# Altium footprint library Standard.PcbLib: 137 footprints (part 8 of 9)
Each footprint in its own frame and in the unit in brackets; x right, y up, seen from the top. Pads: shape width x height; smd on the part's side, far side on the other; paste and mask are expansions set on the pad; w line width, h text height; cw(c..) or ccw(c..) is an arc to the next point about the centre after c.
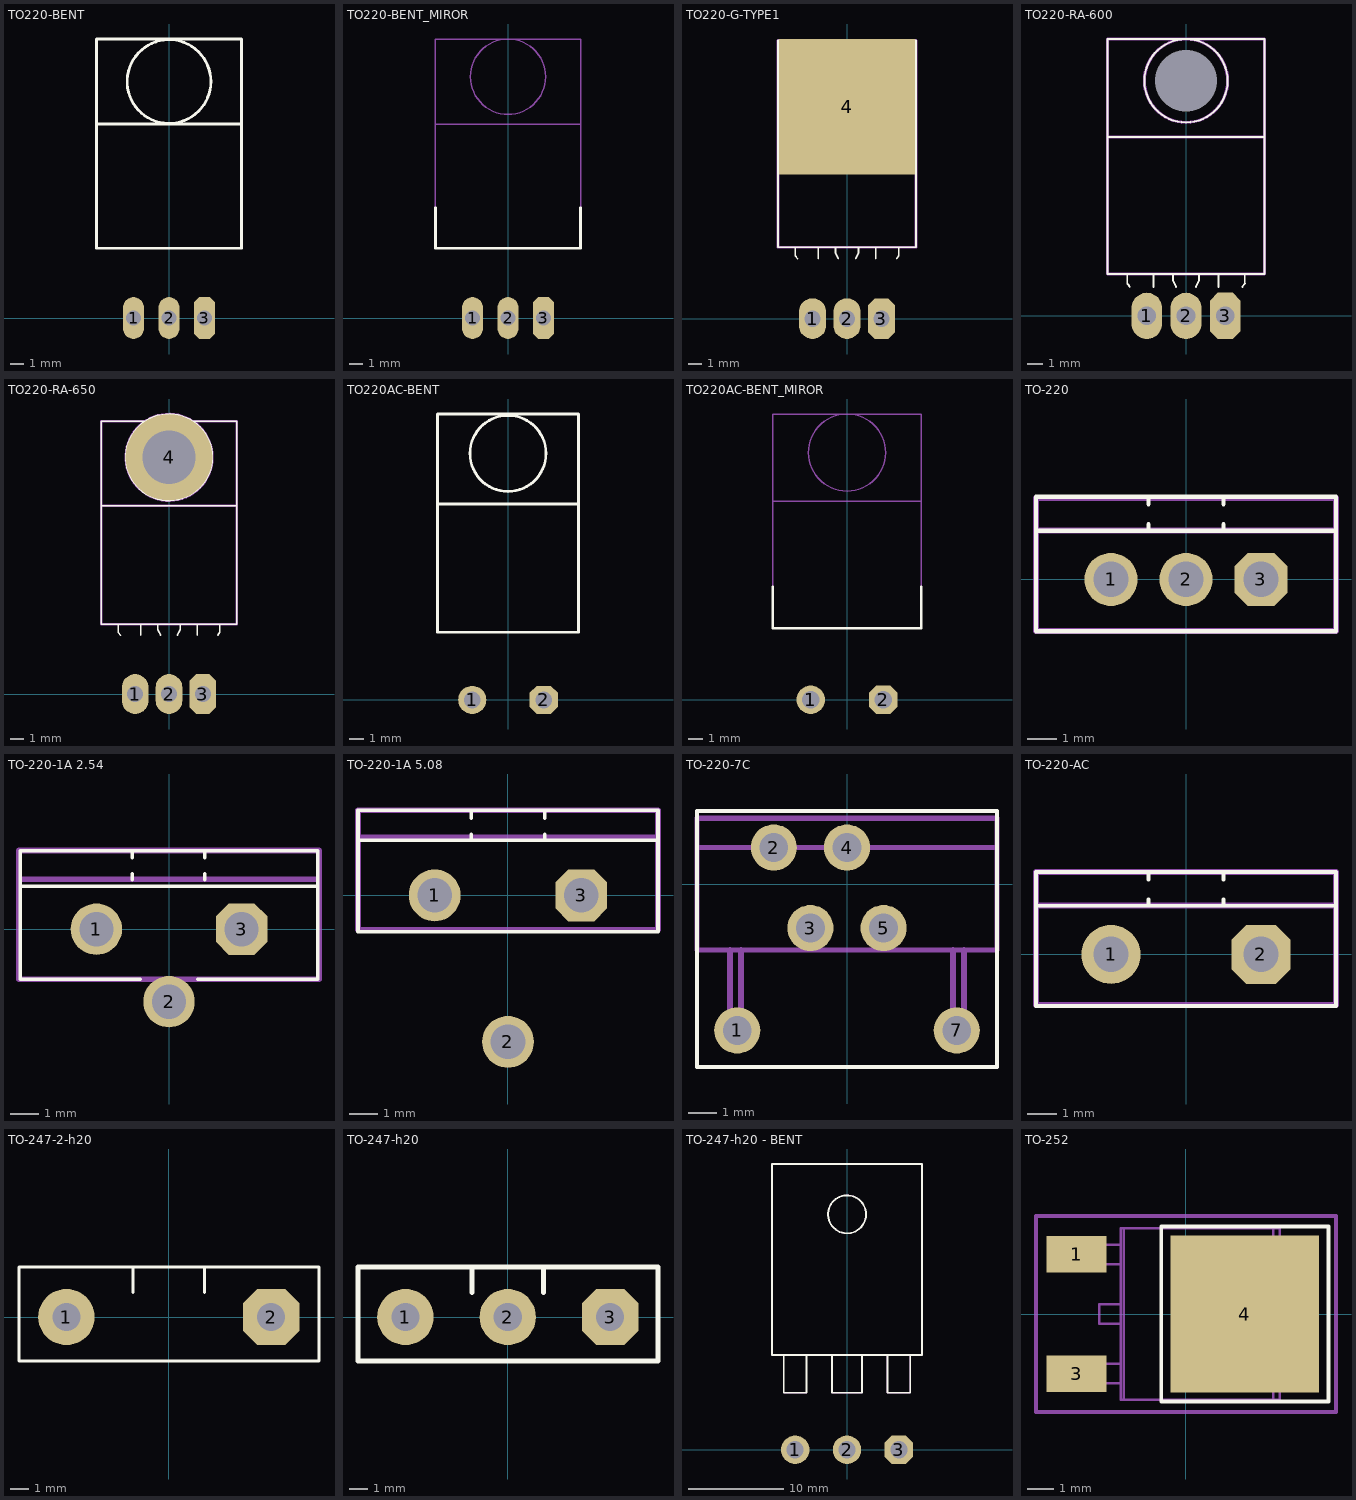
[diagram p7: the footprints below, top view; thin cyan lines are the x and y axes]

## TO220-BENT [mm]
pads (3):
  oval 1.5x3 hole 1.1: 1(-2.54,0) 2(0,0)
  oct 1.5x3 hole 1.1: 3(2.54,0)
Top Overlay:
  circle w0.2: c0,16.95 r3
  lines w0.2: -5.2,13.9 5.2,13.9 ; -5.2,5 -5.2,20 5.2,20 5.2,5 -5.2,5
Top Assembly:
  circle w0.1: c0,16.95 r3
  lines w0.1: -5.2,13.899 5.2,13.9 ; -5.2,5.009 -5.2,20 5.2,20 5.2,5.009 -5.2,5.009
3D body "TO-220_horizontal_line.stp": height 4.7, standoff -2.95, extent -5.25,-0.3 5.25,19.95

## TO220-BENT_MIROR [mm]
pads (3):
  oval 1.5x3 hole 1.1: 1(-2.54,0) 2(0,0)
  oct 1.5x3 hole 1.1: 3(2.54,0)
Top Overlay:
  lines w0.2: -5.2,7.9 -5.2,5 5.2,5 5.2,7.9
Top Assembly:
  circle w0.1: c0,17.3 r2.7
  lines w0.1: -5.2,13.899 5.2,13.9 ; -5.2,5.009 5.2,5.009 5.2,20 -5.2,20 -5.2,5.009
3D body "TO-220_horizontal_back_line.stp": height 3.8, standoff -6.2, extent -5.25,-0.3 5.25,19.95

## TO220-G-TYPE1 [mm]
pads (4):
  oval 2x3 hole 1.2: 1(-2.54,0) 2(0,0)
  oct 2x3 hole 1.2: 3(2.54,0)
  rect 10x10 smd: 4(0,15.6)
Top Overlay:
  circle w0.125: c0,17.78 r2.7
  lines w0.125: -5.08,14.139 5.08,14.139 ; -3.81,4.614 -3.81,5.249 ; -3.762,4.582 -3.647,4.421 ; -2.117,4.421 -2.117,5.249 ; -0.847,5.249 -0.847,4.826 -0.635,4.421 ; 0.635,4.421 0.847,4.826 0.847,5.249 ; 2.117,4.421 2.117,5.249 ; 3.655,4.421 3.818,4.638 ; 3.81,4.614 3.81,5.249 ; -5.08,5.249 5.08,5.249 5.08,20.489 -5.08,20.489 -5.08,5.249
Top Assembly:
  circle w0.2: c0,17.78 r2.7
  lines w0.2: -5.08,14.139 5.08,14.139 ; -5.08,5.249 5.08,5.249 5.08,20.489 -5.08,20.489 -5.08,5.249
3D body "TO220-RA-650.STEP": height 4.45, standoff -1.79, extent -5.08,-0.19 5.08,20.36

## TO220-RA-600 [mm]
pads (4):
  oval 2x3 hole 1.2: 1(-2.54,0) 2(0,0)
  round 0 hole 4 unplated: 2(0,15.24)
  oct 2x3 hole 1.2: 3(2.54,0)
Top Overlay:
  circle w0.125: c0,15.24 r2.7
  lines w0.125: -5.08,11.599 5.08,11.599 ; -3.81,2.074 -3.81,2.709 ; -3.762,2.042 -3.647,1.881 ; -2.117,1.881 -2.117,2.709 ; -0.847,2.709 -0.847,2.286 -0.635,1.881 ; 0.635,1.881 0.847,2.286 0.847,2.709 ; 2.117,1.881 2.117,2.709 ; 3.655,1.881 3.818,2.098 ; 3.81,2.074 3.81,2.709 ; -5.08,2.709 5.08,2.709 5.08,17.949 -5.08,17.949 -5.08,2.709
Top Assembly:
  circle w0.2: c0,15.24 r2.7
  lines w0.2: -5.08,11.599 5.08,11.599 ; -5.08,2.709 5.08,2.709 5.08,17.949 -5.08,17.949 -5.08,2.709
3D body "TO220-RA-600.STEP": height 4.45, standoff -1.79, extent -5.08,-0.19 5.08,17.78

## TO220-RA-650 [mm]
pads (4):
  oval 2x3 hole 1.2: 1(-2.54,0) 2(0,0)
  oct 2x3 hole 1.2: 3(2.54,0)
  round 6.5 hole 4: 4(0,17.78)
Top Overlay:
  circle w0.125: c0,17.78 r3.25
  lines w0.125: -5.08,14.139 5.08,14.139 ; -3.81,4.614 -3.81,5.249 ; -3.762,4.582 -3.647,4.421 ; -2.117,4.421 -2.117,5.249 ; -0.847,5.249 -0.847,4.826 -0.635,4.421 ; 0.635,4.421 0.847,4.826 0.847,5.249 ; 2.117,4.421 2.117,5.249 ; 3.655,4.421 3.818,4.638 ; 3.81,4.614 3.81,5.249 ; -5.08,5.249 -5.08,20.489 5.08,20.489 5.08,5.249 -5.08,5.249
Top Assembly:
  circle w0.2: c0,17.78 r3.25
  lines w0.2: -5.08,14.139 5.08,14.139 ; -5.08,5.249 -5.08,20.489 5.08,20.489 5.08,5.249 -5.08,5.249
3D body "TO220-RA-650.STEP": height 4.45, standoff -1.79, extent -5.08,-0.19 5.08,20.36

## TO220AC-BENT [mm]
pads (2):
  round 2 hole 1.2: 1(-2.54,0)
  oct 2x2 hole 1.2: 2(2.54,0)
Top Overlay:
  circle w0.2: c0,17.5 r2.7
  lines w0.2: -5,13.9 5,13.9 ; -5,20.25 -5,4.8 5,4.8 5,20.25 ; -5,20.3 5,20.3
Top Assembly:
  circle w0.1: c0,17.5 r2.7
  lines w0.1: -5,13.899 5,13.9 ; -5,4.8 5,4.8 5,20.3 -5,20.3 -5,4.8
3D body "User Library-TO220-2pin bent.STEP": height 4.6, standoff -2.47, extent -5,-0.3 5,20.3

## TO220AC-BENT_MIROR [mm]
pads (2):
  round 2 hole 1.2: 1(-2.54,0)
  oct 2x2 hole 1.2: 2(2.54,0)
Top Overlay:
  lines w0.2: -5.2,7.9 -5.2,5 5.2,5 5.2,7.9
Top Assembly:
  circle w0.1: c0,17.3 r2.7
  lines w0.1: -5.2,13.899 5.2,13.9 ; -5.2,5.009 5.2,5.009 5.2,20 -5.2,20 -5.2,5.009
3D body "User Library-TO220-2_OR-INV.STEP": height 2.02, standoff -6.2, extent -5,-0.3 5,20.3

## TO-220 [mm]
pads (3):
  round 1.8 hole 1.2: 1(-2.54,0) 2(0,0)
  oct 1.8x1.8 hole 1.2: 3(2.54,0)
Top Overlay:
  lines w0.15: -5.08,1.651 5.08,1.651 ; -1.27,1.651 -1.27,1.863 ; -1.27,2.54 -1.27,2.794 ; 1.27,1.651 1.27,1.863 ; 1.27,2.54 1.27,2.794 ; -5.08,-1.749 5.08,-1.749 5.08,2.794 -5.08,2.794 -5.08,-1.749
Top Assembly:
  lines w0.2: -5.08,1.651 5.08,1.651 ; -5.08,-1.742 5.08,-1.742 5.08,2.758 -5.08,2.758 -5.08,-1.742
3D body "User Library-TO-220-4.STEP": height 25.06, standoff -3.74, extent -5.12,-1.742 5.08,2.758

## TO-220-1A 2.54 [mm]
pads (3):
  round 1.8 hole 1.2: 1(-2.54,0) 2(0,-2.54)
  oct 1.8x1.8 hole 1.2: 3(2.54,0)
Top Overlay:
  lines w0.125: -5.2,1.5 5.2,1.5 ; -1.29,1.734 -1.29,1.946 ; -1.29,2.496 -1.29,2.75 ; -1,-1.75 -2.525,-1.75 -5.2,-1.75 -5.2,2.75 5.2,2.75 5.2,-1.75 1,-1.75 ; 1.25,1.734 1.25,1.946 ; 1.25,2.496 1.25,2.75
Top Assembly:
  lines w0.2: -0.35,-1.75 -0.35,-2.259 ; 0.45,-1.75 0.45,-2.259 ; -5.25,1.75 -5.25,2.75 5.25,2.75 5.25,1.75 ; -5.25,1.75 5.25,1.75 ; -5.25,1.75 -5.25,1.1 -5.25,-1.75 5.25,-1.75 5.25,1.75 ; -0.35,-2.259 -0.35,-2.495 0.45,-2.495 0.45,-2.259 ; -0.35,-2.259 0.45,-2.259
3D body "TO220-1A 2.54.STEP": height 23.29, standoff -3.87, extent -5.2,-2.991 5.2,2.75

## TO-220-1A 5.08 [mm]
pads (3):
  round 1.8 hole 1.2: 1(-2.54,0) 2(0,-5.08)
  oct 1.8x1.8 hole 1.2: 3(2.54,0)
Top Overlay:
  lines w0.125: -5.2,1.905 5.2,1.905 ; -1.27,1.905 -1.27,2.117 ; -1.27,2.667 -1.27,2.921 ; 1.27,1.905 1.27,2.117 ; 1.27,2.667 1.27,2.921 ; -5.2,-1.27 5.2,-1.27 5.2,2.95 -5.2,2.95 -5.2,-1.27
Top Assembly:
  lines w0.2: -5.2,2 5.2,2 ; -5.2,-1.191 5.2,-1.191 5.2,2.95 -5.2,2.95 -5.2,-1.191
3D body "TO220-1A 5.08.STEP": height 23.29, standoff -2.41, extent -5.2,-5.331 5.2,2.95

## TO-220-7C [mm]
pads (6):
  round 1.6 hole 1: 1(-3.81,-5.08) 2(-2.54,1.27) 3(-1.27,-1.524) 4(0,1.27) 5(1.27,-1.524) 7(3.81,-5.08)
Top Overlay:
  lines w0.15: -5.207,-6.35 5.207,-6.35 5.207,2.54 -5.207,2.54 -5.207,-6.35
Top Assembly:
  lines w0.178: -5.207,1.27 5.207,1.27 ; -5.207,-2.286 5.207,-2.286 5.207,2.286 -5.207,2.286 -5.207,-2.286
  lines w0.2: -4.064,-2.286 -4.064,-5.461 -3.683,-5.461 -3.683,-5.08 -3.683,-2.286 ; 3.683,-2.286 3.683,-5.461 4.064,-5.461 4.064,-5.08 4.064,-2.286
3D body "User Library-TO-220-7C.step": height 19.26, standoff -2.18, extent -5.193,-5.463 5.207,2.667

## TO-220-AC [mm]
pads (2):
  round 2 hole 1.2: 1(-2.54,0)
  oct 2x2 hole 1.2: 2(2.54,0)
Top Overlay:
  lines w0.125: -5.08,1.651 5.08,1.651 ; -1.27,1.651 -1.27,1.863 ; -1.27,2.54 -1.27,2.794 ; 1.27,1.651 1.27,1.863 ; 1.27,2.54 1.27,2.794 ; -5.08,-1.749 5.08,-1.749 5.08,2.794 -5.08,2.794 -5.08,-1.749
Top Assembly:
  lines w0.2: -5,1.651 5,1.651 ; -5.08,-1.706 5.08,-1.706 5.08,2.794 -5.08,2.794 -5.08,-1.706
3D body "User Library-TO220-2_V-L.STEP": height 25.04, standoff -4.46, extent -5,-1.706 5,2.794

## TO-247-2-h20 [mm]
pads (2):
  round 3 hole 1.5: 1(-5.45,0)
  oct 3x3 hole 1.5: 2(5.45,0)
Top Overlay:
  lines w0.15: -1.905,1.3 -1.905,2.66 ; 1.905,1.3 1.905,2.66 ; -7.975,-2.34 -7.975,2.66 8,2.66 8,-2.34 -7.975,-2.34
3D body "User Library-TO247-2.step": height 26, standoff -15.07, extent -7.962,-2.37 7.988,2.66

## TO-247-h20 [mm]
pads (3):
  round 3 hole 1.5: 1(-5.45,0) 2(0,0)
  oct 3x3 hole 1.5: 3(5.45,0)
Top Overlay:
  lines w0.254: -1.905,1.3 -1.905,2.66 ; 1.905,1.3 1.905,2.66 ; -7.975,-2.34 -7.975,2.66 8,2.66 8,-2.34 -7.975,-2.34
Top Assembly:
  lines w0.15: 8,-2.34 8,2.66
  lines w0.2: -1.905,1.3 -1.905,2.66 ; 1.905,1.3 1.905,2.66 ; 8,-2.34 -7.975,-2.34 -7.975,2.66 8,2.66
3D body "TO247-10.STEP": height 26.2, standoff -4.38, extent -8,-2.34 8,2.66

## TO-247-h20 - BENT [mm]
pads (3):
  round 3 hole 1.8: 1(-5.46,0) 2(0,0)
  oct 3x3 hole 1.8: 3(5.46,0)
Top Overlay:
  circle w0.2: c0,24.8 r2
  lines w0.2: -6.66,10 -6.66,6 -4.26,6 -4.26,10 ; -1.6,10 -1.6,6 1.6,6 1.6,10 ; 3.02,10 3.22,10 ; 4.26,10 4.26,6 6.66,6 6.66,10 ; -7.9,10 7.9,10 7.9,30.1 -7.9,30.1 -7.9,10
Top Assembly:
  circle w0.1: c0,24.8 r2
  lines w0.1: -6.66,10 -6.66,6 -4.26,6 -4.26,10 ; -1.6,10 -1.6,6 1.6,6 1.6,10 ; 4.26,10 4.26,6 6.66,6 6.66,10 ; -7.9,10 7.9,10 7.9,30.1 -7.9,30.1 -7.9,10
3D body "TO-247_horizontal_line.stp": height 5, standoff -3, extent -7.8,-0.5 7.8,30.1

## TO-252 [mm] "D-PAK, 3-Pads, Body 6,20x6,71mm (max), IPC Medium Density"
height 2.3
pads (3):
  rect 2.3x1.4 smd: 1(-4.191,2.286) 3(-4.191,-2.286)
  rect 5.7x6 smd: 4(2.25,0)
Top Overlay:
  lines w0.15: -0.95,-3.35 -0.95,3.35 5.461,3.35 5.461,-3.35 -0.95,-3.35
Top Assembly:
  lines w0.1: -4.3,-2.66 -4.1,-2.66 ; -4.3,-2.66 -4.9,-2.66 -4.9,-1.91 -4.3,-1.91 ; -4.3,-2.66 -4.3,-1.91 ; -4.3,-1.91 -4.1,-1.91 ; -4.3,1.91 -4.1,1.91 ; -4.3,1.91 -4.9,1.91 -4.9,2.66 -4.3,2.66 ; -4.3,1.91 -4.3,2.66 ; -4.3,2.66 -4.1,2.66 ; -4.1,-2.66 -4.1,-1.91 ; -4.1,-2.66 -3.45,-2.66 ; -4.1,-1.91 -3.45,-1.91 ; -4.1,1.91 -4.1,2.66 ; -4.1,1.91 -3.45,1.91 ; -4.1,2.66 -3.45,2.66 ; -3.45,-2.66 -2.5,-2.66 ; -3.45,-2.66 -3.45,-1.91 ; -3.45,-1.91 -2.5,-1.91 ; -3.45,1.91 -2.5,1.91 ; -3.45,1.91 -3.45,2.66 ; -3.45,2.66 -2.5,2.66 ; -2.5,-2.66 -2.5,-3.29 -2.39,-3.29 ; -2.5,-2.66 -2.5,-1.91 ; -2.5,-1.91 -2.5,-0.375 ; -2.5,-0.375 -2.5,0.375 ; -2.5,-0.375 -3.33,-0.375 -3.33,0.375 -2.5,0.375 ; -2.5,0.375 -2.5,1.91 ; -2.5,1.91 -2.5,2.66 ; -2.5,2.66 -2.5,3.29 -2.39,3.29 ; -2.39,-3.29 -2.39,3.29 ; -2.39,-3.29 3.35,-3.29 ; -2.39,3.29 3.35,3.29 ; 3.35,-3.29 3.6,-3.29 3.6,-2.68 ; 3.35,-3.29 3.35,3.29 ; 3.35,3.29 3.6,3.29 3.6,2.68 ; 3.6,-2.68 3.6,-1.675 ; 3.6,-2.68 4.8,-2.68 4.8,-1.93 4.3,-1.93 4.3,1.93 4.8,1.93 4.8,2.68 3.6,2.68 ; 3.6,-1.675 ccw(c3.55,-1.43) 3.8,-1.43 3.8,1.43 ccw(c3.55,1.43) 3.6,1.675 ; 3.6,-1.675 3.6,1.675 ; 3.6,1.675 3.6,2.68
Top Component Outline:
  lines w0.15: -0.5,0 0.5,0 ; 0,-0.5 0,0.5 ; -5.75,-3.75 -5.75,3.75 5.75,3.75 5.75,-3.75 -5.75,-3.75
3D body "TO-252.STEP": height 2.35, standoff 0, extent -5.06,-3.29 5.08,3.29